# Altium schematic symbol library jlcpcb_2025_04_capacitors_extended_0805.schlib: 3281 symbols (part 4 of 18) (continued)
## 0805N390J500CT
designator C?  Capacitance: 39pF  (hidden comment: *)
Capacitor, Ceramic (MLCC), 39pF, ±5%, 50V, NP0, ±5%, SMD 0805; Manufacturer: Walsin Tech Corp; Manufacturer Part Number: 0805N390J500CT; Package Size: 0805; JLCPCB Basic Part: No; JLCPCB Part Number: C296098; Supplier 1: LCSC; Category: Capacitors - MLCC; Supplier Part Number 1: C296098; Tolerance: ±5%; Voltage Rating: 50V; Temperature Coefficient: NP0; RoHS: Yes; ComponentLink1Description: Datasheet; ComponentLink1URL: https://wmsc.lcsc.com/wmsc/upload/file/pdf/v2/lcsc/2304140030_Walsin-Tech-Corp-0805N390J500CT_C296098.pdf; ComponentLink2Description: JLCPCB Part URL; ComponentLink2URL: https://jlcpcb.com/partdetail/C296098; ComponentLink3Description: LCSC Part URL; ComponentLink3URL: https://lcsc.com/product-detail/Multilayer-Ceramic-Capacitors-MLCC---SMD-SMT_Walsin-Tech-Corp-Walsin-Tech-Corp-0805N390J500CT_C296098.html
footprint CAP-0805 (0805 (2012M) Capacitor)
pins: 1, 2

## 0805N391F500CT
designator C?  Capacitance: 390pF  (hidden comment: *)
Capacitor, Ceramic (MLCC), 390pF, ±1%, 50V, NP0, ±1%, SMD 0805; Manufacturer: Walsin Tech Corp; Manufacturer Part Number: 0805N391F500CT; Package Size: 0805; JLCPCB Basic Part: No; JLCPCB Part Number: C303931; Supplier 1: LCSC; Category: Capacitors - MLCC; Supplier Part Number 1: C303931; Tolerance: ±1%; Voltage Rating: 50V; Temperature Coefficient: NP0; RoHS: Yes; ComponentLink1Description: Datasheet; ComponentLink1URL: https://wmsc.lcsc.com/wmsc/upload/file/pdf/v2/lcsc/2304140030_Walsin-Tech-Corp-0805N391F500CT_C303931.pdf; ComponentLink2Description: JLCPCB Part URL; ComponentLink2URL: https://jlcpcb.com/partdetail/C303931; ComponentLink3Description: LCSC Part URL; ComponentLink3URL: https://lcsc.com/product-detail/Multilayer-Ceramic-Capacitors-MLCC---SMD-SMT_Walsin-Tech-Corp-Walsin-Tech-Corp-0805N391F500CT_C303931.html
footprint CAP-0805 (0805 (2012M) Capacitor)
pins: 1, 2

## 0805N391J500CT
designator C?  Capacitance: 390pF  (hidden comment: *)
Capacitor, Ceramic (MLCC), 390pF, ±5%, 50V, NP0, ±5%, SMD 0805; Manufacturer: Walsin Tech Corp; Manufacturer Part Number: 0805N391J500CT; Package Size: 0805; JLCPCB Basic Part: No; JLCPCB Part Number: C296099; Supplier 1: LCSC; Category: Capacitors - MLCC; Supplier Part Number 1: C296099; Tolerance: ±5%; Voltage Rating: 50V; Temperature Coefficient: NP0; RoHS: Yes; ComponentLink1Description: Datasheet; ComponentLink1URL: https://wmsc.lcsc.com/wmsc/upload/file/pdf/v2/lcsc/2304140030_Walsin-Tech-Corp-0805N391J500CT_C296099.pdf; ComponentLink2Description: JLCPCB Part URL; ComponentLink2URL: https://jlcpcb.com/partdetail/C296099; ComponentLink3Description: LCSC Part URL; ComponentLink3URL: https://lcsc.com/product-detail/Multilayer-Ceramic-Capacitors-MLCC---SMD-SMT_Walsin-Tech-Corp-Walsin-Tech-Corp-0805N391J500CT_C296099.html
footprint CAP-0805 (0805 (2012M) Capacitor)
pins: 1, 2

## 0805N430J500CT
designator C?  Capacitance: 43pF  (hidden comment: *)
Capacitor, Ceramic (MLCC), 43pF, ±5%, 50V, C0G, ±5%, SMD 0805; Manufacturer: Walsin Tech Corp; Manufacturer Part Number: 0805N430J500CT; Package Size: 0805; JLCPCB Basic Part: No; JLCPCB Part Number: C3842037; Supplier 1: LCSC; Category: Capacitors - MLCC; Supplier Part Number 1: C3842037; Tolerance: ±5%; Voltage Rating: 50V; Temperature Coefficient: C0G; RoHS: Yes; ComponentLink1Description: Datasheet; ComponentLink1URL: https://wmsc.lcsc.com/wmsc/upload/file/pdf/v2/lcsc/2309201537_Walsin-Tech-Corp-0805N430J500CT_C3842037.pdf; ComponentLink2Description: JLCPCB Part URL; ComponentLink2URL: https://jlcpcb.com/partdetail/C3842037; ComponentLink3Description: LCSC Part URL; ComponentLink3URL: https://lcsc.com/product-detail/Multilayer-Ceramic-Capacitors-MLCC---SMD-SMT_Walsin-Tech-Corp-Walsin-Tech-Corp-0805N430J500CT_C3842037.html
footprint CAP-0805 (0805 (2012M) Capacitor)
pins: 1, 2

## 0805N470J101CT
designator C?  Capacitance: 47pF  (hidden comment: *)
Capacitor, Ceramic (MLCC), 47pF, ±5%, 100V, NP0, ±5%, SMD 0805; Manufacturer: Walsin Tech Corp; Manufacturer Part Number: 0805N470J101CT; Package Size: 0805; JLCPCB Basic Part: No; JLCPCB Part Number: C458934; Supplier 1: LCSC; Category: Capacitors - MLCC; Supplier Part Number 1: C458934; Tolerance: ±5%; Voltage Rating: 100V; Temperature Coefficient: NP0; RoHS: Yes; ComponentLink1Description: Datasheet; ComponentLink1URL: https://wmsc.lcsc.com/wmsc/upload/file/pdf/v2/lcsc/2304140030_Walsin-Tech-Corp-0805N470J101CT_C458934.pdf; ComponentLink2Description: JLCPCB Part URL; ComponentLink2URL: https://jlcpcb.com/partdetail/C458934; ComponentLink3Description: LCSC Part URL; ComponentLink3URL: https://lcsc.com/product-detail/Multilayer-Ceramic-Capacitors-MLCC---SMD-SMT_Walsin-Tech-Corp-Walsin-Tech-Corp-0805N470J101CT_C458934.html
footprint CAP-0805 (0805 (2012M) Capacitor)
pins: 1, 2

## 0805N470J102CT
designator C?  Capacitance: 47pF  (hidden comment: *)
Capacitor, Ceramic (MLCC), 47pF, ±5%, 1kV, C0G, ±5%, SMD 0805; Manufacturer: Walsin Tech Corp; Manufacturer Part Number: 0805N470J102CT; Package Size: 0805; JLCPCB Basic Part: No; JLCPCB Part Number: C3833065; Supplier 1: LCSC; Category: Capacitors - MLCC; Supplier Part Number 1: C3833065; Tolerance: ±5%; Voltage Rating: 1kV; Temperature Coefficient: C0G; RoHS: Yes; ComponentLink1Description: Datasheet; ComponentLink1URL: https://wmsc.lcsc.com/wmsc/upload/file/pdf/v2/lcsc/2309201537_Walsin-Tech-Corp-0805N470J102CT_C3833065.pdf; ComponentLink2Description: JLCPCB Part URL; ComponentLink2URL: https://jlcpcb.com/partdetail/C3833065; ComponentLink3Description: LCSC Part URL; ComponentLink3URL: https://lcsc.com/product-detail/Multilayer-Ceramic-Capacitors-MLCC---SMD-SMT_Walsin-Tech-Corp-Walsin-Tech-Corp-0805N470J102CT_C3833065.html
footprint CAP-0805 (0805 (2012M) Capacitor)
pins: 1, 2

## 0805N470J201CT
designator C?  Capacitance: 47pF  (hidden comment: *)
Capacitor, Ceramic (MLCC), 47pF, ±5%, 200V, NP0, ±5%, SMD 0805; Manufacturer: Walsin Tech Corp; Manufacturer Part Number: 0805N470J201CT; Package Size: 0805; JLCPCB Basic Part: No; JLCPCB Part Number: C396757; Supplier 1: LCSC; Category: Capacitors - MLCC; Supplier Part Number 1: C396757; Tolerance: ±5%; Voltage Rating: 200V; Temperature Coefficient: NP0; RoHS: Yes; ComponentLink1Description: Datasheet; ComponentLink1URL: https://wmsc.lcsc.com/wmsc/upload/file/pdf/v2/lcsc/2304140030_Walsin-Tech-Corp-0805N470J201CT_C396757.pdf; ComponentLink2Description: JLCPCB Part URL; ComponentLink2URL: https://jlcpcb.com/partdetail/C396757; ComponentLink3Description: LCSC Part URL; ComponentLink3URL: https://lcsc.com/product-detail/Multilayer-Ceramic-Capacitors-MLCC---SMD-SMT_Walsin-Tech-Corp-Walsin-Tech-Corp-0805N470J201CT_C396757.html
footprint CAP-0805 (0805 (2012M) Capacitor)
pins: 1, 2

## 0805N470J251CT
designator C?  Capacitance: 47pF  (hidden comment: *)
Capacitor, Ceramic (MLCC), 47pF, ±5%, 250V, NP0, ±5%, SMD 0805; Manufacturer: Walsin Tech Corp; Manufacturer Part Number: 0805N470J251CT; Package Size: 0805; JLCPCB Basic Part: No; JLCPCB Part Number: C152976; Supplier 1: LCSC; Category: Capacitors - MLCC; Supplier Part Number 1: C152976; Tolerance: ±5%; Voltage Rating: 250V; Temperature Coefficient: NP0; RoHS: Yes; ComponentLink1Description: Datasheet; ComponentLink1URL: https://wmsc.lcsc.com/wmsc/upload/file/pdf/v2/lcsc/2304140030_Walsin-Tech-Corp-0805N470J251CT_C152976.pdf; ComponentLink2Description: JLCPCB Part URL; ComponentLink2URL: https://jlcpcb.com/partdetail/C152976; ComponentLink3Description: LCSC Part URL; ComponentLink3URL: https://lcsc.com/product-detail/Multilayer-Ceramic-Capacitors-MLCC---SMD-SMT_Walsin-Tech-Corp-Walsin-Tech-Corp-0805N470J251CT_C152976.html
footprint CAP-0805 (0805 (2012M) Capacitor)
pins: 1, 2

## 0805N470J500CT
designator C?  Capacitance: 47pF  (hidden comment: *)
Capacitor, Ceramic (MLCC), 47pF, ±5%, 50V, NP0, ±5%, SMD 0805; Manufacturer: Walsin Tech Corp; Manufacturer Part Number: 0805N470J500CT; Package Size: 0805; JLCPCB Basic Part: No; JLCPCB Part Number: C123648; Supplier 1: LCSC; Category: Capacitors - MLCC; Supplier Part Number 1: C123648; Tolerance: ±5%; Voltage Rating: 50V; Temperature Coefficient: NP0; RoHS: Yes; ComponentLink1Description: Datasheet; ComponentLink1URL: https://wmsc.lcsc.com/wmsc/upload/file/pdf/v2/lcsc/2304140030_Walsin-Tech-Corp-0805N470J500CT_C123648.pdf; ComponentLink2Description: JLCPCB Part URL; ComponentLink2URL: https://jlcpcb.com/partdetail/C123648; ComponentLink3Description: LCSC Part URL; ComponentLink3URL: https://lcsc.com/product-detail/Multilayer-Ceramic-Capacitors-MLCC---SMD-SMT_Walsin-Tech-Corp-Walsin-Tech-Corp-0805N470J500CT_C123648.html
footprint CAP-0805 (0805 (2012M) Capacitor)
pins: 1, 2

## 0805N470J501CT
designator C?  Capacitance: 47pF  (hidden comment: *)
Capacitor, Ceramic (MLCC), 47pF, ±5%, 500V, NP0, ±5%, SMD 0805; Manufacturer: Walsin Tech Corp; Manufacturer Part Number: 0805N470J501CT; Package Size: 0805; JLCPCB Basic Part: No; JLCPCB Part Number: C77488; Supplier 1: LCSC; Category: Capacitors - MLCC; Supplier Part Number 1: C77488; Tolerance: ±5%; Voltage Rating: 500V; Temperature Coefficient: NP0; RoHS: Yes; ComponentLink1Description: Datasheet; ComponentLink1URL: https://wmsc.lcsc.com/wmsc/upload/file/pdf/v2/lcsc/2304140030_Walsin-Tech-Corp-0805N470J501CT_C77488.pdf; ComponentLink2Description: JLCPCB Part URL; ComponentLink2URL: https://jlcpcb.com/partdetail/C77488; ComponentLink3Description: LCSC Part URL; ComponentLink3URL: https://lcsc.com/product-detail/Multilayer-Ceramic-Capacitors-MLCC---SMD-SMT_Walsin-Tech-Corp-Walsin-Tech-Corp-0805N470J501CT_C77488.html
footprint CAP-0805 (0805 (2012M) Capacitor)
pins: 1, 2

## 0805N471F500CT
designator C?  Capacitance: 470pF  (hidden comment: *)
Capacitor, Ceramic (MLCC), 470pF, ±1%, 50V, NP0, ±1%, SMD 0805; Manufacturer: Walsin Tech Corp; Manufacturer Part Number: 0805N471F500CT; Package Size: 0805; JLCPCB Basic Part: No; JLCPCB Part Number: C396758; Supplier 1: LCSC; Category: Capacitors - MLCC; Supplier Part Number 1: C396758; Tolerance: ±1%; Voltage Rating: 50V; Temperature Coefficient: NP0; RoHS: Yes; ComponentLink1Description: Datasheet; ComponentLink1URL: https://wmsc.lcsc.com/wmsc/upload/file/pdf/v2/lcsc/2304140030_Walsin-Tech-Corp-0805N471F500CT_C396758.pdf; ComponentLink2Description: JLCPCB Part URL; ComponentLink2URL: https://jlcpcb.com/partdetail/C396758; ComponentLink3Description: LCSC Part URL; ComponentLink3URL: https://lcsc.com/product-detail/Multilayer-Ceramic-Capacitors-MLCC---SMD-SMT_Walsin-Tech-Corp-Walsin-Tech-Corp-0805N471F500CT_C396758.html
footprint CAP-0805 (0805 (2012M) Capacitor)
pins: 1, 2

## 0805N471J101
designator C?  Capacitance: 470pF  (hidden comment: *)
Capacitor, Ceramic (MLCC), 470pF, ±5%, 100V, NP0, ±5%, SMD 0805; Manufacturer: Walsin Tech Corp; Manufacturer Part Number: 0805N471J101; Package Size: 0805; JLCPCB Basic Part: No; JLCPCB Part Number: C152844; Supplier 1: LCSC; Category: Capacitors - MLCC; Supplier Part Number 1: C152844; Tolerance: ±5%; Voltage Rating: 100V; Temperature Coefficient: NP0; RoHS: Yes; ComponentLink1Description: Datasheet; ComponentLink1URL: https://wmsc.lcsc.com/wmsc/upload/file/pdf/v2/lcsc/2304140030_Walsin-Tech-Corp-0805N471J101_C152844.pdf; ComponentLink2Description: JLCPCB Part URL; ComponentLink2URL: https://jlcpcb.com/partdetail/C152844; ComponentLink3Description: LCSC Part URL; ComponentLink3URL: https://lcsc.com/product-detail/Multilayer-Ceramic-Capacitors-MLCC---SMD-SMT_Walsin-Tech-Corp-Walsin-Tech-Corp-0805N471J101_C152844.html
footprint CAP-0805 (0805 (2012M) Capacitor)
pins: 1, 2

## 0805N471J201CT
designator C?  Capacitance: 470pF  (hidden comment: *)
Capacitor, Ceramic (MLCC), 470pF, ±5%, 200V, NP0, ±5%, SMD 0805; Manufacturer: Walsin Tech Corp; Manufacturer Part Number: 0805N471J201CT; Package Size: 0805; JLCPCB Basic Part: No; JLCPCB Part Number: C237218; Supplier 1: LCSC; Category: Capacitors - MLCC; Supplier Part Number 1: C237218; Tolerance: ±5%; Voltage Rating: 200V; Temperature Coefficient: NP0; RoHS: Yes; ComponentLink1Description: Datasheet; ComponentLink1URL: https://wmsc.lcsc.com/wmsc/upload/file/pdf/v2/lcsc/2304140030_Walsin-Tech-Corp-0805N471J201CT_C237218.pdf; ComponentLink2Description: JLCPCB Part URL; ComponentLink2URL: https://jlcpcb.com/partdetail/C237218; ComponentLink3Description: LCSC Part URL; ComponentLink3URL: https://lcsc.com/product-detail/Multilayer-Ceramic-Capacitors-MLCC---SMD-SMT_Walsin-Tech-Corp-Walsin-Tech-Corp-0805N471J201CT_C237218.html
footprint CAP-0805 (0805 (2012M) Capacitor)
pins: 1, 2

## 0805N471J251CT
designator C?  Capacitance: 470pF  (hidden comment: *)
Capacitor, Ceramic (MLCC), 470pF, ±5%, 250V, NP0, ±5%, SMD 0805; Manufacturer: Walsin Tech Corp; Manufacturer Part Number: 0805N471J251CT; Package Size: 0805; JLCPCB Basic Part: No; JLCPCB Part Number: C77489; Supplier 1: LCSC; Category: Capacitors - MLCC; Supplier Part Number 1: C77489; Tolerance: ±5%; Voltage Rating: 250V; Temperature Coefficient: NP0; RoHS: Yes; ComponentLink1Description: Datasheet; ComponentLink1URL: https://wmsc.lcsc.com/wmsc/upload/file/pdf/v2/lcsc/2304140030_Walsin-Tech-Corp-0805N471J251CT_C77489.pdf; ComponentLink2Description: JLCPCB Part URL; ComponentLink2URL: https://jlcpcb.com/partdetail/C77489; ComponentLink3Description: LCSC Part URL; ComponentLink3URL: https://lcsc.com/product-detail/Multilayer-Ceramic-Capacitors-MLCC---SMD-SMT_Walsin-Tech-Corp-Walsin-Tech-Corp-0805N471J251CT_C77489.html
footprint CAP-0805 (0805 (2012M) Capacitor)
pins: 1, 2

## 0805N471J500CT
designator C?  Capacitance: 470pF  (hidden comment: *)
Capacitor, Ceramic (MLCC), 470pF, ±5%, 50V, NP0, ±5%, SMD 0805; Manufacturer: Walsin Tech Corp; Manufacturer Part Number: 0805N471J500CT; Package Size: 0805; JLCPCB Basic Part: No; JLCPCB Part Number: C163163; Supplier 1: LCSC; Category: Capacitors - MLCC; Supplier Part Number 1: C163163; Tolerance: ±5%; Voltage Rating: 50V; Temperature Coefficient: NP0; RoHS: Yes; ComponentLink1Description: Datasheet; ComponentLink1URL: https://wmsc.lcsc.com/wmsc/upload/file/pdf/v2/lcsc/1810191413_Walsin-Tech-Corp-0805N471J500CT_C163163.pdf; ComponentLink2Description: JLCPCB Part URL; ComponentLink2URL: https://jlcpcb.com/partdetail/C163163; ComponentLink3Description: LCSC Part URL; ComponentLink3URL: https://lcsc.com/product-detail/Multilayer-Ceramic-Capacitors-MLCC---SMD-SMT_Walsin-Tech-Corp-Walsin-Tech-Corp-0805N471J500CT_C163163.html
footprint CAP-0805 (0805 (2012M) Capacitor)
pins: 1, 2

## 0805N472J160CT
designator C?  Capacitance: 4.7nF  (hidden comment: *)
Capacitor, Ceramic (MLCC), 4.7nF, ±5%, 16V, NP0, ±5%, SMD 0805; Manufacturer: Walsin Tech Corp; Manufacturer Part Number: 0805N472J160CT; Package Size: 0805; JLCPCB Basic Part: No; JLCPCB Part Number: C396760; Supplier 1: LCSC; Category: Capacitors - MLCC; Supplier Part Number 1: C396760; Tolerance: ±5%; Voltage Rating: 16V; Temperature Coefficient: NP0; RoHS: Yes; ComponentLink1Description: Datasheet; ComponentLink1URL: https://wmsc.lcsc.com/wmsc/upload/file/pdf/v2/lcsc/2304140030_Walsin-Tech-Corp-0805N472J160CT_C396760.pdf; ComponentLink2Description: JLCPCB Part URL; ComponentLink2URL: https://jlcpcb.com/partdetail/C396760; ComponentLink3Description: LCSC Part URL; ComponentLink3URL: https://lcsc.com/product-detail/Multilayer-Ceramic-Capacitors-MLCC---SMD-SMT_Walsin-Tech-Corp-Walsin-Tech-Corp-0805N472J160CT_C396760.html
footprint CAP-0805 (0805 (2012M) Capacitor)
pins: 1, 2

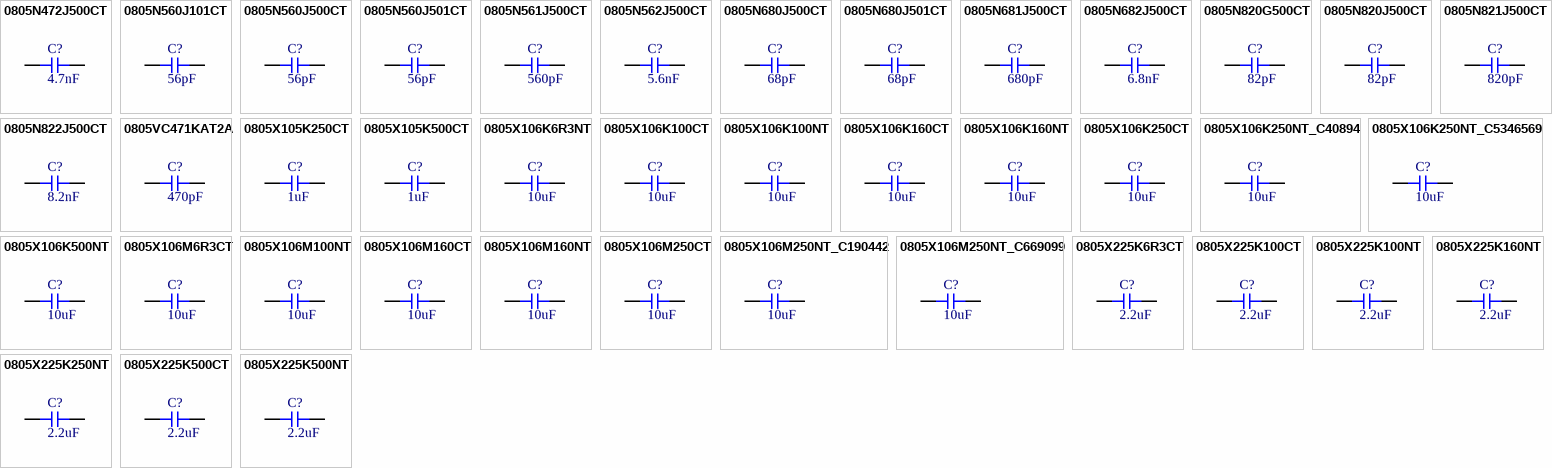
[diagram p16: symbols 0805N472J500CT to 0805X225K500NT]

## 0805N472J500CT
designator C?  Capacitance: 4.7nF  (hidden comment: *)
Capacitor, Ceramic (MLCC), 4.7nF, ±5%, 50V, NP0, ±5%, SMD 0805; Manufacturer: Walsin Tech Corp; Manufacturer Part Number: 0805N472J500CT; Package Size: 0805; JLCPCB Basic Part: No; JLCPCB Part Number: C396761; Supplier 1: LCSC; Category: Capacitors - MLCC; Supplier Part Number 1: C396761; Tolerance: ±5%; Voltage Rating: 50V; Temperature Coefficient: NP0; RoHS: Yes; ComponentLink1Description: Datasheet; ComponentLink1URL: https://wmsc.lcsc.com/wmsc/upload/file/pdf/v2/lcsc/2304140030_Walsin-Tech-Corp-0805N472J500CT_C396761.pdf; ComponentLink2Description: JLCPCB Part URL; ComponentLink2URL: https://jlcpcb.com/partdetail/C396761; ComponentLink3Description: LCSC Part URL; ComponentLink3URL: https://lcsc.com/product-detail/Multilayer-Ceramic-Capacitors-MLCC---SMD-SMT_Walsin-Tech-Corp-Walsin-Tech-Corp-0805N472J500CT_C396761.html
footprint CAP-0805 (0805 (2012M) Capacitor)
pins: 1, 2

## 0805N560J101CT
designator C?  Capacitance: 56pF  (hidden comment: *)
Capacitor, Ceramic (MLCC), 56pF, ±5%, 100V, NP0, ±5%, SMD 0805; Manufacturer: Walsin Tech Corp; Manufacturer Part Number: 0805N560J101CT; Package Size: 0805; JLCPCB Basic Part: No; JLCPCB Part Number: C77490; Supplier 1: LCSC; Category: Capacitors - MLCC; Supplier Part Number 1: C77490; Tolerance: ±5%; Voltage Rating: 100V; Temperature Coefficient: NP0; RoHS: Yes; ComponentLink1Description: Datasheet; ComponentLink1URL: https://wmsc.lcsc.com/wmsc/upload/file/pdf/v2/lcsc/2304140030_Walsin-Tech-Corp-0805N560J101CT_C77490.pdf; ComponentLink2Description: JLCPCB Part URL; ComponentLink2URL: https://jlcpcb.com/partdetail/C77490; ComponentLink3Description: LCSC Part URL; ComponentLink3URL: https://lcsc.com/product-detail/Multilayer-Ceramic-Capacitors-MLCC---SMD-SMT_Walsin-Tech-Corp-Walsin-Tech-Corp-0805N560J101CT_C77490.html
footprint CAP-0805 (0805 (2012M) Capacitor)
pins: 1, 2

## 0805N560J500CT
designator C?  Capacitance: 56pF  (hidden comment: *)
Capacitor, Ceramic (MLCC), 56pF, ±5%, 50V, NP0, ±5%, SMD 0805; Manufacturer: Walsin Tech Corp; Manufacturer Part Number: 0805N560J500CT; Package Size: 0805; JLCPCB Basic Part: No; JLCPCB Part Number: C296102; Supplier 1: LCSC; Category: Capacitors - MLCC; Supplier Part Number 1: C296102; Tolerance: ±5%; Voltage Rating: 50V; Temperature Coefficient: NP0; RoHS: Yes; ComponentLink1Description: Datasheet; ComponentLink1URL: https://wmsc.lcsc.com/wmsc/upload/file/pdf/v2/lcsc/2304140030_Walsin-Tech-Corp-0805N560J500CT_C296102.pdf; ComponentLink2Description: JLCPCB Part URL; ComponentLink2URL: https://jlcpcb.com/partdetail/C296102; ComponentLink3Description: LCSC Part URL; ComponentLink3URL: https://lcsc.com/product-detail/Multilayer-Ceramic-Capacitors-MLCC---SMD-SMT_Walsin-Tech-Corp-Walsin-Tech-Corp-0805N560J500CT_C296102.html
footprint CAP-0805 (0805 (2012M) Capacitor)
pins: 1, 2

## 0805N560J501CT
designator C?  Capacitance: 56pF  (hidden comment: *)
Capacitor, Ceramic (MLCC), 56pF, ±5%, 500V, NP0, ±5%, SMD 0805; Manufacturer: Walsin Tech Corp; Manufacturer Part Number: 0805N560J501CT; Package Size: 0805; JLCPCB Basic Part: No; JLCPCB Part Number: C396763; Supplier 1: LCSC; Category: Capacitors - MLCC; Supplier Part Number 1: C396763; Tolerance: ±5%; Voltage Rating: 500V; Temperature Coefficient: NP0; RoHS: Yes; ComponentLink1Description: Datasheet; ComponentLink1URL: https://wmsc.lcsc.com/wmsc/upload/file/pdf/v2/lcsc/2304140030_Walsin-Tech-Corp-0805N560J501CT_C396763.pdf; ComponentLink2Description: JLCPCB Part URL; ComponentLink2URL: https://jlcpcb.com/partdetail/C396763; ComponentLink3Description: LCSC Part URL; ComponentLink3URL: https://lcsc.com/product-detail/Multilayer-Ceramic-Capacitors-MLCC---SMD-SMT_Walsin-Tech-Corp-Walsin-Tech-Corp-0805N560J501CT_C396763.html
footprint CAP-0805 (0805 (2012M) Capacitor)
pins: 1, 2

## 0805N561J500CT
designator C?  Capacitance: 560pF  (hidden comment: *)
Capacitor, Ceramic (MLCC), 560pF, ±5%, 50V, NP0, ±5%, SMD 0805; Manufacturer: Walsin Tech Corp; Manufacturer Part Number: 0805N561J500CT; Package Size: 0805; JLCPCB Basic Part: No; JLCPCB Part Number: C296103; Supplier 1: LCSC; Category: Capacitors - MLCC; Supplier Part Number 1: C296103; Tolerance: ±5%; Voltage Rating: 50V; Temperature Coefficient: NP0; RoHS: Yes; ComponentLink1Description: Datasheet; ComponentLink1URL: https://wmsc.lcsc.com/wmsc/upload/file/pdf/v2/lcsc/2304140030_Walsin-Tech-Corp-0805N561J500CT_C296103.pdf; ComponentLink2Description: JLCPCB Part URL; ComponentLink2URL: https://jlcpcb.com/partdetail/C296103; ComponentLink3Description: LCSC Part URL; ComponentLink3URL: https://lcsc.com/product-detail/Multilayer-Ceramic-Capacitors-MLCC---SMD-SMT_Walsin-Tech-Corp-Walsin-Tech-Corp-0805N561J500CT_C296103.html
footprint CAP-0805 (0805 (2012M) Capacitor)
pins: 1, 2

## 0805N562J500CT
designator C?  Capacitance: 5.6nF  (hidden comment: *)
Capacitor, Ceramic (MLCC), 5.6nF, ±5%, 50V, NP0, ±5%, SMD 0805; Manufacturer: Walsin Tech Corp; Manufacturer Part Number: 0805N562J500CT; Package Size: 0805; JLCPCB Basic Part: No; JLCPCB Part Number: C396764; Supplier 1: LCSC; Category: Capacitors - MLCC; Supplier Part Number 1: C396764; Tolerance: ±5%; Voltage Rating: 50V; Temperature Coefficient: NP0; RoHS: Yes; ComponentLink1Description: Datasheet; ComponentLink1URL: https://wmsc.lcsc.com/wmsc/upload/file/pdf/v2/lcsc/2304140030_Walsin-Tech-Corp-0805N562J500CT_C396764.pdf; ComponentLink2Description: JLCPCB Part URL; ComponentLink2URL: https://jlcpcb.com/partdetail/C396764; ComponentLink3Description: LCSC Part URL; ComponentLink3URL: https://lcsc.com/product-detail/Multilayer-Ceramic-Capacitors-MLCC---SMD-SMT_Walsin-Tech-Corp-Walsin-Tech-Corp-0805N562J500CT_C396764.html
footprint CAP-0805 (0805 (2012M) Capacitor)
pins: 1, 2

## 0805N680J500CT
designator C?  Capacitance: 68pF  (hidden comment: *)
Capacitor, Ceramic (MLCC), 68pF, ±5%, 50V, NP0, ±5%, SMD 0805; Manufacturer: Walsin Tech Corp; Manufacturer Part Number: 0805N680J500CT; Package Size: 0805; JLCPCB Basic Part: No; JLCPCB Part Number: C123650; Supplier 1: LCSC; Category: Capacitors - MLCC; Supplier Part Number 1: C123650; Tolerance: ±5%; Voltage Rating: 50V; Temperature Coefficient: NP0; RoHS: Yes; ComponentLink1Description: Datasheet; ComponentLink1URL: https://wmsc.lcsc.com/wmsc/upload/file/pdf/v2/lcsc/2304140030_Walsin-Tech-Corp-0805N680J500CT_C123650.pdf; ComponentLink2Description: JLCPCB Part URL; ComponentLink2URL: https://jlcpcb.com/partdetail/C123650; ComponentLink3Description: LCSC Part URL; ComponentLink3URL: https://lcsc.com/product-detail/Multilayer-Ceramic-Capacitors-MLCC---SMD-SMT_Walsin-Tech-Corp-Walsin-Tech-Corp-0805N680J500CT_C123650.html
footprint CAP-0805 (0805 (2012M) Capacitor)
pins: 1, 2

## 0805N680J501CT
designator C?  Capacitance: 68pF  (hidden comment: *)
Capacitor, Ceramic (MLCC), 68pF, ±5%, 500V, NP0, ±5%, SMD 0805; Manufacturer: Walsin Tech Corp; Manufacturer Part Number: 0805N680J501CT; Package Size: 0805; JLCPCB Basic Part: No; JLCPCB Part Number: C396765; Supplier 1: LCSC; Category: Capacitors - MLCC; Supplier Part Number 1: C396765; Tolerance: ±5%; Voltage Rating: 500V; Temperature Coefficient: NP0; RoHS: Yes; ComponentLink1Description: Datasheet; ComponentLink1URL: https://wmsc.lcsc.com/wmsc/upload/file/pdf/v2/lcsc/2304140030_Walsin-Tech-Corp-0805N680J501CT_C396765.pdf; ComponentLink2Description: JLCPCB Part URL; ComponentLink2URL: https://jlcpcb.com/partdetail/C396765; ComponentLink3Description: LCSC Part URL; ComponentLink3URL: https://lcsc.com/product-detail/Multilayer-Ceramic-Capacitors-MLCC---SMD-SMT_Walsin-Tech-Corp-Walsin-Tech-Corp-0805N680J501CT_C396765.html
footprint CAP-0805 (0805 (2012M) Capacitor)
pins: 1, 2

## 0805N681J500CT
designator C?  Capacitance: 680pF  (hidden comment: *)
Capacitor, Ceramic (MLCC), 680pF, ±5%, 50V, NP0, ±5%, SMD 0805; Manufacturer: Walsin Tech Corp; Manufacturer Part Number: 0805N681J500CT; Package Size: 0805; JLCPCB Basic Part: No; JLCPCB Part Number: C384742; Supplier 1: LCSC; Category: Capacitors - MLCC; Supplier Part Number 1: C384742; Tolerance: ±5%; Voltage Rating: 50V; Temperature Coefficient: NP0; RoHS: Yes; ComponentLink1Description: Datasheet; ComponentLink1URL: https://wmsc.lcsc.com/wmsc/upload/file/pdf/v2/lcsc/2304140030_Walsin-Tech-Corp-0805N681J500CT_C384742.pdf; ComponentLink2Description: JLCPCB Part URL; ComponentLink2URL: https://jlcpcb.com/partdetail/C384742; ComponentLink3Description: LCSC Part URL; ComponentLink3URL: https://lcsc.com/product-detail/Multilayer-Ceramic-Capacitors-MLCC---SMD-SMT_Walsin-Tech-Corp-Walsin-Tech-Corp-0805N681J500CT_C384742.html
footprint CAP-0805 (0805 (2012M) Capacitor)
pins: 1, 2

## 0805N682J500CT
designator C?  Capacitance: 6.8nF  (hidden comment: *)
Capacitor, Ceramic (MLCC), 6.8nF, ±5%, 50V, NP0, ±5%, SMD 0805; Manufacturer: Walsin Tech Corp; Manufacturer Part Number: 0805N682J500CT; Package Size: 0805; JLCPCB Basic Part: No; JLCPCB Part Number: C396766; Supplier 1: LCSC; Category: Capacitors - MLCC; Supplier Part Number 1: C396766; Tolerance: ±5%; Voltage Rating: 50V; Temperature Coefficient: NP0; RoHS: Yes; ComponentLink1Description: Datasheet; ComponentLink1URL: https://wmsc.lcsc.com/wmsc/upload/file/pdf/v2/lcsc/2204121445_Walsin-Tech-Corp-0805N682J500CT_C396766.pdf; ComponentLink2Description: JLCPCB Part URL; ComponentLink2URL: https://jlcpcb.com/partdetail/C396766; ComponentLink3Description: LCSC Part URL; ComponentLink3URL: https://lcsc.com/product-detail/Multilayer-Ceramic-Capacitors-MLCC---SMD-SMT_Walsin-Tech-Corp-Walsin-Tech-Corp-0805N682J500CT_C396766.html
footprint CAP-0805 (0805 (2012M) Capacitor)
pins: 1, 2

## 0805N820G500CT
designator C?  Capacitance: 82pF  (hidden comment: *)
Capacitor, Ceramic (MLCC), 82pF, ±2%, 50V, NP0, ±2%, SMD 0805; Manufacturer: Walsin Tech Corp; Manufacturer Part Number: 0805N820G500CT; Package Size: 0805; JLCPCB Basic Part: No; JLCPCB Part Number: C509272; Supplier 1: LCSC; Category: Capacitors - MLCC; Supplier Part Number 1: C509272; Tolerance: ±2%; Voltage Rating: 50V; Temperature Coefficient: NP0; RoHS: Yes; ComponentLink1Description: Datasheet; ComponentLink1URL: https://wmsc.lcsc.com/wmsc/upload/file/pdf/v2/lcsc/2304140030_Walsin-Tech-Corp-0805N820G500CT_C509272.pdf; ComponentLink2Description: JLCPCB Part URL; ComponentLink2URL: https://jlcpcb.com/partdetail/C509272; ComponentLink3Description: LCSC Part URL; ComponentLink3URL: https://lcsc.com/product-detail/Multilayer-Ceramic-Capacitors-MLCC---SMD-SMT_Walsin-Tech-Corp-Walsin-Tech-Corp-0805N820G500CT_C509272.html
footprint CAP-0805 (0805 (2012M) Capacitor)
pins: 1, 2

## 0805N820J500CT
designator C?  Capacitance: 82pF  (hidden comment: *)
Capacitor, Ceramic (MLCC), 82pF, ±5%, 50V, NP0, ±5%, SMD 0805; Manufacturer: Walsin Tech Corp; Manufacturer Part Number: 0805N820J500CT; Package Size: 0805; JLCPCB Basic Part: No; JLCPCB Part Number: C296106; Supplier 1: LCSC; Category: Capacitors - MLCC; Supplier Part Number 1: C296106; Tolerance: ±5%; Voltage Rating: 50V; Temperature Coefficient: NP0; RoHS: Yes; ComponentLink1Description: Datasheet; ComponentLink1URL: https://wmsc.lcsc.com/wmsc/upload/file/pdf/v2/lcsc/2304140030_Walsin-Tech-Corp-0805N820J500CT_C296106.pdf; ComponentLink2Description: JLCPCB Part URL; ComponentLink2URL: https://jlcpcb.com/partdetail/C296106; ComponentLink3Description: LCSC Part URL; ComponentLink3URL: https://lcsc.com/product-detail/Multilayer-Ceramic-Capacitors-MLCC---SMD-SMT_Walsin-Tech-Corp-Walsin-Tech-Corp-0805N820J500CT_C296106.html
footprint CAP-0805 (0805 (2012M) Capacitor)
pins: 1, 2

## 0805N821J500CT
designator C?  Capacitance: 820pF  (hidden comment: *)
Capacitor, Ceramic (MLCC), 820pF, ±5%, 50V, NP0, ±5%, SMD 0805; Manufacturer: Walsin Tech Corp; Manufacturer Part Number: 0805N821J500CT; Package Size: 0805; JLCPCB Basic Part: No; JLCPCB Part Number: C458935; Supplier 1: LCSC; Category: Capacitors - MLCC; Supplier Part Number 1: C458935; Tolerance: ±5%; Voltage Rating: 50V; Temperature Coefficient: NP0; RoHS: Yes; ComponentLink1Description: Datasheet; ComponentLink1URL: https://wmsc.lcsc.com/wmsc/upload/file/pdf/v2/lcsc/2304140030_Walsin-Tech-Corp-0805N821J500CT_C458935.pdf; ComponentLink2Description: JLCPCB Part URL; ComponentLink2URL: https://jlcpcb.com/partdetail/C458935; ComponentLink3Description: LCSC Part URL; ComponentLink3URL: https://lcsc.com/product-detail/Multilayer-Ceramic-Capacitors-MLCC---SMD-SMT_Walsin-Tech-Corp-Walsin-Tech-Corp-0805N821J500CT_C458935.html
footprint CAP-0805 (0805 (2012M) Capacitor)
pins: 1, 2

## 0805N822J500CT
designator C?  Capacitance: 8.2nF  (hidden comment: *)
Capacitor, Ceramic (MLCC), 8.2nF, ±5%, 50V, NP0, ±5%, SMD 0805; Manufacturer: Walsin Tech Corp; Manufacturer Part Number: 0805N822J500CT; Package Size: 0805; JLCPCB Basic Part: No; JLCPCB Part Number: C296107; Supplier 1: LCSC; Category: Capacitors - MLCC; Supplier Part Number 1: C296107; Tolerance: ±5%; Voltage Rating: 50V; Temperature Coefficient: NP0; RoHS: Yes; ComponentLink1Description: Datasheet; ComponentLink1URL: https://wmsc.lcsc.com/wmsc/upload/file/pdf/v2/lcsc/2304140030_Walsin-Tech-Corp-0805N822J500CT_C296107.pdf; ComponentLink2Description: JLCPCB Part URL; ComponentLink2URL: https://jlcpcb.com/partdetail/C296107; ComponentLink3Description: LCSC Part URL; ComponentLink3URL: https://lcsc.com/product-detail/Multilayer-Ceramic-Capacitors-MLCC---SMD-SMT_Walsin-Tech-Corp-Walsin-Tech-Corp-0805N822J500CT_C296107.html
footprint CAP-0805 (0805 (2012M) Capacitor)
pins: 1, 2

## 0805VC471KAT2A
designator C?  Capacitance: 470pF  (hidden comment: *)
Capacitor, Ceramic (MLCC), 470pF, ±10%, 250V, X7R, ±10%, SMD 0805; Manufacturer: AVX; Manufacturer Part Number: 0805VC471KAT2A; Package Size: 0805; JLCPCB Basic Part: No; JLCPCB Part Number: C308793; Supplier 1: LCSC; Category: Capacitors - MLCC; Supplier Part Number 1: C308793; Tolerance: ±10%; Voltage Rating: 250V; Temperature Coefficient: X7R; RoHS: Yes; ComponentLink1Description: Datasheet; ComponentLink1URL: https://wmsc.lcsc.com/wmsc/upload/file/pdf/v2/lcsc/1912111437_Kyocera-AVX-0805VC471KAT2A_C308793.pdf; ComponentLink2Description: JLCPCB Part URL; ComponentLink2URL: https://jlcpcb.com/partdetail/C308793; ComponentLink3Description: LCSC Part URL; ComponentLink3URL: https://lcsc.com/product-detail/Multilayer-Ceramic-Capacitors-MLCC---SMD-SMT_Kyocera-AVX-Kyocera-AVX-0805VC471KAT2A_C308793.html
footprint CAP-0805 (0805 (2012M) Capacitor)
pins: 1, 2

## 0805X105K250CT
designator C?  Capacitance: 1uF  (hidden comment: *)
Capacitor, Ceramic (MLCC), 1uF, ±10%, 25V, X5R, ±10%, SMD 0805; Manufacturer: Walsin Tech Corp; Manufacturer Part Number: 0805X105K250CT; Package Size: 0805; JLCPCB Basic Part: No; JLCPCB Part Number: C107456; Supplier 1: LCSC; Category: Capacitors - MLCC; Supplier Part Number 1: C107456; Tolerance: ±10%; Voltage Rating: 25V; Temperature Coefficient: X5R; RoHS: Yes; ComponentLink1Description: Datasheet; ComponentLink1URL: https://wmsc.lcsc.com/wmsc/upload/file/pdf/v2/lcsc/2304140030_Walsin-Tech-Corp-0805X105K250CT_C107456.pdf; ComponentLink2Description: JLCPCB Part URL; ComponentLink2URL: https://jlcpcb.com/partdetail/C107456; ComponentLink3Description: LCSC Part URL; ComponentLink3URL: https://lcsc.com/product-detail/Multilayer-Ceramic-Capacitors-MLCC---SMD-SMT_Walsin-Tech-Corp-Walsin-Tech-Corp-0805X105K250CT_C107456.html
footprint CAP-0805 (0805 (2012M) Capacitor)
pins: 1, 2

## 0805X105K500CT
designator C?  Capacitance: 1uF  (hidden comment: *)
Capacitor, Ceramic (MLCC), 1uF, ±10%, 50V, X5R, ±10%, SMD 0805; Manufacturer: Walsin Tech Corp; Manufacturer Part Number: 0805X105K500CT; Package Size: 0805; JLCPCB Basic Part: No; JLCPCB Part Number: C107573; Supplier 1: LCSC; Category: Capacitors - MLCC; Supplier Part Number 1: C107573; Tolerance: ±10%; Voltage Rating: 50V; Temperature Coefficient: X5R; RoHS: Yes; ComponentLink1Description: Datasheet; ComponentLink1URL: https://wmsc.lcsc.com/wmsc/upload/file/pdf/v2/lcsc/2304140030_Walsin-Tech-Corp-0805X105K500CT_C107573.pdf; ComponentLink2Description: JLCPCB Part URL; ComponentLink2URL: https://jlcpcb.com/partdetail/C107573; ComponentLink3Description: LCSC Part URL; ComponentLink3URL: https://lcsc.com/product-detail/Multilayer-Ceramic-Capacitors-MLCC---SMD-SMT_Walsin-Tech-Corp-Walsin-Tech-Corp-0805X105K500CT_C107573.html
footprint CAP-0805 (0805 (2012M) Capacitor)
pins: 1, 2

## 0805X106K6R3NT
designator C?  Capacitance: 10uF  (hidden comment: *)
Capacitor, Ceramic (MLCC), 10uF, ±10%, 6.3V, X5R, ±10%, SMD 0805; Manufacturer: FH (Guangdong Fenghua Advanced Tech); Manufacturer Part Number: 0805X106K6R3NT; Package Size: 0805; JLCPCB Basic Part: No; JLCPCB Part Number: C2897295; Supplier 1: LCSC; Category: Capacitors - MLCC; Supplier Part Number 1: C2897295; Tolerance: ±10%; Voltage Rating: 6.3V; Temperature Coefficient: X5R; RoHS: Yes; ComponentLink1Description: Datasheet; ComponentLink1URL: https://wmsc.lcsc.com/wmsc/upload/file/pdf/v2/lcsc/2109180930_FH--Guangdong-Fenghua-Advanced-Tech-0805X106K6R3NT_C2897295.pdf; ComponentLink2Description: JLCPCB Part URL; ComponentLink2URL: https://jlcpcb.com/partdetail/C2897295; ComponentLink3Description: LCSC Part URL; ComponentLink3URL: https://lcsc.com/product-detail/Multilayer-Ceramic-Capacitors-MLCC---SMD-SMT_FH-Guangdong-Fenghua-Advanced-Tech-FH-Guangdong-Fenghua-Advanced-Tech-0805X106K6R3NT_C2897295.html
footprint CAP-0805 (0805 (2012M) Capacitor)
pins: 1, 2

## 0805X106K100CT
designator C?  Capacitance: 10uF  (hidden comment: *)
Capacitor, Ceramic (MLCC), 10uF, ±10%, 10V, X5R, ±10%, SMD 0805; Manufacturer: Walsin Tech Corp; Manufacturer Part Number: 0805X106K100CT; Package Size: 0805; JLCPCB Basic Part: No; JLCPCB Part Number: C105505; Supplier 1: LCSC; Category: Capacitors - MLCC; Supplier Part Number 1: C105505; Tolerance: ±10%; Voltage Rating: 10V; Temperature Coefficient: X5R; RoHS: Yes; ComponentLink1Description: Datasheet; ComponentLink1URL: https://wmsc.lcsc.com/wmsc/upload/file/pdf/v2/lcsc/2304140030_Walsin-Tech-Corp-0805X106K100CT_C105505.pdf; ComponentLink2Description: JLCPCB Part URL; ComponentLink2URL: https://jlcpcb.com/partdetail/C105505; ComponentLink3Description: LCSC Part URL; ComponentLink3URL: https://lcsc.com/product-detail/Multilayer-Ceramic-Capacitors-MLCC---SMD-SMT_Walsin-Tech-Corp-Walsin-Tech-Corp-0805X106K100CT_C105505.html
footprint CAP-0805 (0805 (2012M) Capacitor)
pins: 1, 2

## 0805X106K100NT
designator C?  Capacitance: 10uF  (hidden comment: *)
Capacitor, Ceramic (MLCC), 10uF, ±10%, 10V, X5R, ±10%, SMD 0805; Manufacturer: FH(Guangdong Fenghua Advanced Tech); Manufacturer Part Number: 0805X106K100NT; Package Size: 0805; JLCPCB Basic Part: No; JLCPCB Part Number: C90543; Supplier 1: LCSC; Category: Capacitors - MLCC; Supplier Part Number 1: C90543; Tolerance: ±10%; Voltage Rating: 10V; Temperature Coefficient: X5R; RoHS: Yes; ComponentLink1Description: Datasheet; ComponentLink1URL: https://wmsc.lcsc.com/wmsc/upload/file/pdf/v2/lcsc/2304140030_FH--Guangdong-Fenghua-Advanced-Tech-0805X106K100NT_C90543.pdf; ComponentLink2Description: JLCPCB Part URL; ComponentLink2URL: https://jlcpcb.com/partdetail/C90543; ComponentLink3Description: LCSC Part URL; ComponentLink3URL: https://lcsc.com/product-detail/Multilayer-Ceramic-Capacitors-MLCC---SMD-SMT_FH-Guangdong-Fenghua-Advanced-Tech-FH-Guangdong-Fenghua-Advanced-Tech-0805X106K100NT_C90543.html
footprint CAP-0805 (0805 (2012M) Capacitor)
pins: 1, 2

## 0805X106K160CT
designator C?  Capacitance: 10uF  (hidden comment: *)
Capacitor, Ceramic (MLCC), 10uF, ±10%, 16V, X5R, ±10%, SMD 0805; Manufacturer: Walsin Tech Corp; Manufacturer Part Number: 0805X106K160CT; Package Size: 0805; JLCPCB Basic Part: No; JLCPCB Part Number: C525503; Supplier 1: LCSC; Category: Capacitors - MLCC; Supplier Part Number 1: C525503; Tolerance: ±10%; Voltage Rating: 16V; Temperature Coefficient: X5R; RoHS: Yes; ComponentLink1Description: Datasheet; ComponentLink1URL: https://wmsc.lcsc.com/wmsc/upload/file/pdf/v2/lcsc/2304140030_Walsin-Tech-Corp-0805X106K160CT_C525503.pdf; ComponentLink2Description: JLCPCB Part URL; ComponentLink2URL: https://jlcpcb.com/partdetail/C525503; ComponentLink3Description: LCSC Part URL; ComponentLink3URL: https://lcsc.com/product-detail/Multilayer-Ceramic-Capacitors-MLCC---SMD-SMT_Walsin-Tech-Corp-Walsin-Tech-Corp-0805X106K160CT_C525503.html
footprint CAP-0805 (0805 (2012M) Capacitor)
pins: 1, 2

## 0805X106K160NT
designator C?  Capacitance: 10uF  (hidden comment: *)
Capacitor, Ceramic (MLCC), 10uF, ±10%, 16V, X5R, ±10%, SMD 0805; Manufacturer: FH(Guangdong Fenghua Advanced Tech); Manufacturer Part Number: 0805X106K160NT; Package Size: 0805; JLCPCB Basic Part: No; JLCPCB Part Number: C89189; Supplier 1: LCSC; Category: Capacitors - MLCC; Supplier Part Number 1: C89189; Tolerance: ±10%; Voltage Rating: 16V; Temperature Coefficient: X5R; RoHS: Yes; ComponentLink1Description: Datasheet; ComponentLink1URL: https://wmsc.lcsc.com/wmsc/upload/file/pdf/v2/lcsc/2304140030_FH--Guangdong-Fenghua-Advanced-Tech-0805X106K160NT_C89189.pdf; ComponentLink2Description: JLCPCB Part URL; ComponentLink2URL: https://jlcpcb.com/partdetail/C89189; ComponentLink3Description: LCSC Part URL; ComponentLink3URL: https://lcsc.com/product-detail/Multilayer-Ceramic-Capacitors-MLCC---SMD-SMT_FH-Guangdong-Fenghua-Advanced-Tech-FH-Guangdong-Fenghua-Advanced-Tech-0805X106K160NT_C89189.html
footprint CAP-0805 (0805 (2012M) Capacitor)
pins: 1, 2

## 0805X106K250CT
designator C?  Capacitance: 10uF  (hidden comment: *)
Capacitor, Ceramic (MLCC), 10uF, ±10%, 25V, X5R, ±10%, SMD 0805; Manufacturer: Walsin Tech Corp; Manufacturer Part Number: 0805X106K250CT; Package Size: 0805; JLCPCB Basic Part: No; JLCPCB Part Number: C89284; Supplier 1: LCSC; Category: Capacitors - MLCC; Supplier Part Number 1: C89284; Tolerance: ±10%; Voltage Rating: 25V; Temperature Coefficient: X5R; RoHS: Yes; ComponentLink1Description: Datasheet; ComponentLink1URL: https://wmsc.lcsc.com/wmsc/upload/file/pdf/v2/lcsc/2304140030_Walsin-Tech-Corp-0805X106K250CT_C89284.pdf; ComponentLink2Description: JLCPCB Part URL; ComponentLink2URL: https://jlcpcb.com/partdetail/C89284; ComponentLink3Description: LCSC Part URL; ComponentLink3URL: https://lcsc.com/product-detail/Multilayer-Ceramic-Capacitors-MLCC---SMD-SMT_Walsin-Tech-Corp-Walsin-Tech-Corp-0805X106K250CT_C89284.html
footprint CAP-0805 (0805 (2012M) Capacitor)
pins: 1, 2

## 0805X106K250NT_C40894
designator C?  Capacitance: 10uF  (hidden comment: *)
Capacitor, Ceramic (MLCC), 10uF, ±10%, 25V, X5R, ±10%, SMD 0805; Manufacturer: FH(Guangdong Fenghua Advanced Tech); Manufacturer Part Number: 0805X106K250NT; Package Size: 0805; JLCPCB Basic Part: No; JLCPCB Part Number: C40894; Supplier 1: LCSC; Category: Capacitors - MLCC; Supplier Part Number 1: C40894; Tolerance: ±10%; Voltage Rating: 25V; Temperature Coefficient: X5R; RoHS: Yes; ComponentLink1Description: Datasheet; ComponentLink1URL: https://wmsc.lcsc.com/wmsc/upload/file/pdf/v2/lcsc/2304140030_FH--Guangdong-Fenghua-Advanced-Tech-0805X106K250NT_C40894.pdf; ComponentLink2Description: JLCPCB Part URL; ComponentLink2URL: https://jlcpcb.com/partdetail/C40894; ComponentLink3Description: LCSC Part URL; ComponentLink3URL: https://lcsc.com/product-detail/Multilayer-Ceramic-Capacitors-MLCC---SMD-SMT_FH-Guangdong-Fenghua-Advanced-Tech-FH-Guangdong-Fenghua-Advanced-Tech-0805X106K250NT_C40894.html
footprint CAP-0805 (0805 (2012M) Capacitor)
pins: 1, 2

## 0805X106K250NT_C5346569
designator C?  Capacitance: 10uF  (hidden comment: *)
Capacitor, Ceramic (MLCC), 10uF, ±10%, 25V, X5R, ±10%, SMD 0805; Manufacturer: FH (Guangdong Fenghua Advanced Tech); Manufacturer Part Number: 0805X106K250NT; Package Size: 0805; JLCPCB Basic Part: No; JLCPCB Part Number: C5346569; Supplier 1: LCSC; Category: Capacitors - MLCC; Supplier Part Number 1: C5346569; Tolerance: ±10%; Voltage Rating: 25V; Temperature Coefficient: X5R; RoHS: Yes; ComponentLink1Description: Datasheet; ComponentLink1URL: https://wmsc.lcsc.com/wmsc/upload/file/pdf/v2/lcsc/2301300930_FH--Guangdong-Fenghua-Advanced-Tech-0805X106K250NT_C5346569.pdf; ComponentLink2Description: JLCPCB Part URL; ComponentLink2URL: https://jlcpcb.com/partdetail/C5346569; ComponentLink3Description: LCSC Part URL; ComponentLink3URL: https://lcsc.com/product-detail/Multilayer-Ceramic-Capacitors-MLCC---SMD-SMT_FH-Guangdong-Fenghua-Advanced-Tech-FH-Guangdong-Fenghua-Advanced-Tech-0805X106K250NT_C5346569.html
footprint CAP-0805 (0805 (2012M) Capacitor)
pins: 1, 2

## 0805X106K500NT
designator C?  Capacitance: 10uF  (hidden comment: *)
Capacitor, Ceramic (MLCC), 10uF, ±10%, 50V, X5R, ±10%, SMD 0805; Manufacturer: FH (Guangdong Fenghua Advanced Tech); Manufacturer Part Number: 0805X106K500NT; Package Size: 0805; JLCPCB Basic Part: No; JLCPCB Part Number: C6117579; Supplier 1: LCSC; Category: Capacitors - MLCC; Supplier Part Number 1: C6117579; Tolerance: ±10%; Voltage Rating: 50V; Temperature Coefficient: X5R; RoHS: Yes; ComponentLink1Description: Datasheet; ComponentLink2Description: JLCPCB Part URL; ComponentLink2URL: https://jlcpcb.com/partdetail/C6117579; ComponentLink3Description: LCSC Part URL; ComponentLink3URL: https://lcsc.com/product-detail/Multilayer-Ceramic-Capacitors-MLCC---SMD-SMT_FH-Guangdong-Fenghua-Advanced-Tech-FH-Guangdong-Fenghua-Advanced-Tech-0805X106K500NT_C6117579.html
footprint CAP-0805 (0805 (2012M) Capacitor)
pins: 1, 2

## 0805X106M6R3CT
designator C?  Capacitance: 10uF  (hidden comment: *)
Capacitor, Ceramic (MLCC), 10uF, ±20%, 6.3V, X5R, ±20%, SMD 0805; Manufacturer: Walsin Tech Corp; Manufacturer Part Number: 0805X106M6R3CT; Package Size: 0805; JLCPCB Basic Part: No; JLCPCB Part Number: C237174; Supplier 1: LCSC; Category: Capacitors - MLCC; Supplier Part Number 1: C237174; Tolerance: ±20%; Voltage Rating: 6.3V; Temperature Coefficient: X5R; RoHS: Yes; ComponentLink1Description: Datasheet; ComponentLink1URL: https://wmsc.lcsc.com/wmsc/upload/file/pdf/v2/lcsc/2304140030_Walsin-Tech-Corp-0805X106M6R3CT_C237174.pdf; ComponentLink2Description: JLCPCB Part URL; ComponentLink2URL: https://jlcpcb.com/partdetail/C237174; ComponentLink3Description: LCSC Part URL; ComponentLink3URL: https://lcsc.com/product-detail/Multilayer-Ceramic-Capacitors-MLCC---SMD-SMT_Walsin-Tech-Corp-Walsin-Tech-Corp-0805X106M6R3CT_C237174.html
footprint CAP-0805 (0805 (2012M) Capacitor)
pins: 1, 2

## 0805X106M100NT
designator C?  Capacitance: 10uF  (hidden comment: *)
Capacitor, Ceramic (MLCC), 10uF, ±20%, 10V, X5R, ±20%, SMD 0805; Manufacturer: FH(Guangdong Fenghua Advanced Tech); Manufacturer Part Number: 0805X106M100NT; Package Size: 0805; JLCPCB Basic Part: No; JLCPCB Part Number: C185804; Supplier 1: LCSC; Category: Capacitors - MLCC; Supplier Part Number 1: C185804; Tolerance: ±20%; Voltage Rating: 10V; Temperature Coefficient: X5R; RoHS: Yes; ComponentLink1Description: Datasheet; ComponentLink1URL: https://wmsc.lcsc.com/wmsc/upload/file/pdf/v2/lcsc/2304140030_FH--Guangdong-Fenghua-Advanced-Tech-0805X106M100NT_C185804.pdf; ComponentLink2Description: JLCPCB Part URL; ComponentLink2URL: https://jlcpcb.com/partdetail/C185804; ComponentLink3Description: LCSC Part URL; ComponentLink3URL: https://lcsc.com/product-detail/Multilayer-Ceramic-Capacitors-MLCC---SMD-SMT_FH-Guangdong-Fenghua-Advanced-Tech-FH-Guangdong-Fenghua-Advanced-Tech-0805X106M100NT_C185804.html
footprint CAP-0805 (0805 (2012M) Capacitor)
pins: 1, 2

## 0805X106M160CT
designator C?  Capacitance: 10uF  (hidden comment: *)
Capacitor, Ceramic (MLCC), 10uF, ±20%, 16V, X5R, ±20%, SMD 0805; Manufacturer: Walsin Tech Corp; Manufacturer Part Number: 0805X106M160CT; Package Size: 0805; JLCPCB Basic Part: No; JLCPCB Part Number: C3892725; Supplier 1: LCSC; Category: Capacitors - MLCC; Supplier Part Number 1: C3892725; Tolerance: ±20%; Voltage Rating: 16V; Temperature Coefficient: X5R; RoHS: Yes; ComponentLink1Description: Datasheet; ComponentLink1URL: https://wmsc.lcsc.com/wmsc/upload/file/pdf/v2/lcsc/2309201537_Walsin-Tech-Corp-0805X106M160CT_C3892725.pdf; ComponentLink2Description: JLCPCB Part URL; ComponentLink2URL: https://jlcpcb.com/partdetail/C3892725; ComponentLink3Description: LCSC Part URL; ComponentLink3URL: https://lcsc.com/product-detail/Multilayer-Ceramic-Capacitors-MLCC---SMD-SMT_Walsin-Tech-Corp-Walsin-Tech-Corp-0805X106M160CT_C3892725.html
footprint CAP-0805 (0805 (2012M) Capacitor)
pins: 1, 2

## 0805X106M160NT
designator C?  Capacitance: 10uF  (hidden comment: *)
Capacitor, Ceramic (MLCC), 10uF, ±20%, 16V, X5R, ±20%, SMD 0805; Manufacturer: FH(Guangdong Fenghua Advanced Tech); Manufacturer Part Number: 0805X106M160NT; Package Size: 0805; JLCPCB Basic Part: No; JLCPCB Part Number: C181790; Supplier 1: LCSC; Category: Capacitors - MLCC; Supplier Part Number 1: C181790; Tolerance: ±20%; Voltage Rating: 16V; Temperature Coefficient: X5R; RoHS: Yes; ComponentLink1Description: Datasheet; ComponentLink1URL: https://wmsc.lcsc.com/wmsc/upload/file/pdf/v2/lcsc/2304140030_FH--Guangdong-Fenghua-Advanced-Tech-0805X106M160NT_C181790.pdf; ComponentLink2Description: JLCPCB Part URL; ComponentLink2URL: https://jlcpcb.com/partdetail/C181790; ComponentLink3Description: LCSC Part URL; ComponentLink3URL: https://lcsc.com/product-detail/Multilayer-Ceramic-Capacitors-MLCC---SMD-SMT_FH-Guangdong-Fenghua-Advanced-Tech-FH-Guangdong-Fenghua-Advanced-Tech-0805X106M160NT_C181790.html
footprint CAP-0805 (0805 (2012M) Capacitor)
pins: 1, 2

## 0805X106M250CT
designator C?  Capacitance: 10uF  (hidden comment: *)
Capacitor, Ceramic (MLCC), 10uF, ±20%, 25V, X5R, ±20%, SMD 0805; Manufacturer: Walsin Tech Corp; Manufacturer Part Number: 0805X106M250CT; Package Size: 0805; JLCPCB Basic Part: No; JLCPCB Part Number: C2909426; Supplier 1: LCSC; Category: Capacitors - MLCC; Supplier Part Number 1: C2909426; Tolerance: ±20%; Voltage Rating: 25V; Temperature Coefficient: X5R; RoHS: Yes; ComponentLink1Description: Datasheet; ComponentLink1URL: https://wmsc.lcsc.com/wmsc/upload/file/pdf/v2/lcsc/2110272130_Walsin-Tech-Corp-0805X106M250CT_C2909426.pdf; ComponentLink2Description: JLCPCB Part URL; ComponentLink2URL: https://jlcpcb.com/partdetail/C2909426; ComponentLink3Description: LCSC Part URL; ComponentLink3URL: https://lcsc.com/product-detail/Multilayer-Ceramic-Capacitors-MLCC---SMD-SMT_Walsin-Tech-Corp-Walsin-Tech-Corp-0805X106M250CT_C2909426.html
footprint CAP-0805 (0805 (2012M) Capacitor)
pins: 1, 2
